# Altium schematic symbol library jlcpcb_2025_04_capacitors_extended_0805.schlib: 3281 symbols (part 6 of 18)
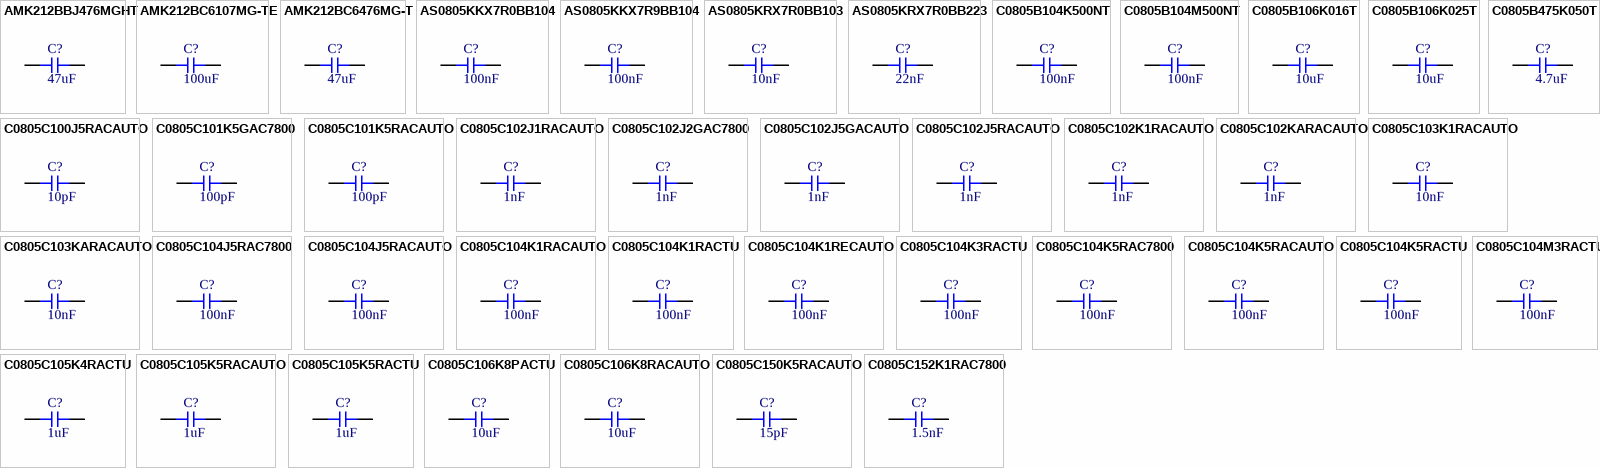
[diagram p87: symbols AMK212BBJ476MGHT to C0805C152K1RAC7800]

## C0805C104K5RACAUTO
designator C?  Capacitance: 100nF  (hidden comment: *)
Capacitor, Ceramic (MLCC), 100nF, ±10%, 50V, X7R, ±10%, SMD 0805; Manufacturer: KEMET; Manufacturer Part Number: C0805C104K5RACAUTO; Package Size: 0805; JLCPCB Basic Part: No; JLCPCB Part Number: C129641; Supplier 1: LCSC; Category: Capacitors - MLCC; Supplier Part Number 1: C129641; Tolerance: ±10%; Voltage Rating: 50V; Temperature Coefficient: X7R; RoHS: Yes; ComponentLink1Description: Datasheet; ComponentLink1URL: https://wmsc.lcsc.com/wmsc/upload/file/pdf/v2/lcsc/2304140030_KEMET-C0805C104K5RACAUTO_C129641.pdf; ComponentLink2Description: JLCPCB Part URL; ComponentLink2URL: https://jlcpcb.com/partdetail/C129641; ComponentLink3Description: LCSC Part URL; ComponentLink3URL: https://lcsc.com/product-detail/Multilayer-Ceramic-Capacitors-MLCC---SMD-SMT_KEMET-KEMET-C0805C104K5RACAUTO_C129641.html
footprint CAP-0805 (0805 (2012M) Capacitor)
pins: 1, 2

## C0805C104K5RACTU
designator C?  Capacitance: 100nF  (hidden comment: *)
Capacitor, Ceramic (MLCC), 100nF, ±10%, 50V, X7R, ±10%, SMD 0805; Manufacturer: KEMET; Manufacturer Part Number: C0805C104K5RACTU; Package Size: 0805; JLCPCB Basic Part: No; JLCPCB Part Number: C3018562; Supplier 1: LCSC; Category: Capacitors - MLCC; Supplier Part Number 1: C3018562; Tolerance: ±10%; Voltage Rating: 50V; Temperature Coefficient: X7R; RoHS: Yes; ComponentLink1Description: Datasheet; ComponentLink1URL: https://wmsc.lcsc.com/wmsc/upload/file/pdf/v2/lcsc/2206221715_KEMET-C0805C104K5RACTU_C3018562.pdf; ComponentLink2Description: JLCPCB Part URL; ComponentLink2URL: https://jlcpcb.com/partdetail/C3018562; ComponentLink3Description: LCSC Part URL; ComponentLink3URL: https://lcsc.com/product-detail/Multilayer-Ceramic-Capacitors-MLCC---SMD-SMT_KEMET-KEMET-C0805C104K5RACTU_C3018562.html
footprint CAP-0805 (0805 (2012M) Capacitor)
pins: 1, 2

## C0805C104M3RACTU
designator C?  Capacitance: 100nF  (hidden comment: *)
Capacitor, Ceramic (MLCC), 100nF, ±20%, 25V, X7R, ±20%, SMD 0805; Manufacturer: KEMET; Manufacturer Part Number: C0805C104M3RACTU; Package Size: 0805; JLCPCB Basic Part: No; JLCPCB Part Number: C2168659; Supplier 1: LCSC; Category: Capacitors - MLCC; Supplier Part Number 1: C2168659; Tolerance: ±20%; Voltage Rating: 25V; Temperature Coefficient: X7R; RoHS: Yes; ComponentLink1Description: Datasheet; ComponentLink1URL: https://wmsc.lcsc.com/wmsc/upload/file/pdf/v2/lcsc/2304140030_KEMET-C0805C104M3RACTU_C2168659.pdf; ComponentLink2Description: JLCPCB Part URL; ComponentLink2URL: https://jlcpcb.com/partdetail/C2168659; ComponentLink3Description: LCSC Part URL; ComponentLink3URL: https://lcsc.com/product-detail/Multilayer-Ceramic-Capacitors-MLCC---SMD-SMT_KEMET-KEMET-C0805C104M3RACTU_C2168659.html
footprint CAP-0805 (0805 (2012M) Capacitor)
pins: 1, 2

## C0805C105K4RACTU
designator C?  Capacitance: 1uF  (hidden comment: *)
Capacitor, Ceramic (MLCC), 1uF, ±10%, 16V, X7R, ±10%, SMD 0805; Manufacturer: KEMET; Manufacturer Part Number: C0805C105K4RACTU; Package Size: 0805; JLCPCB Basic Part: No; JLCPCB Part Number: C2167376; Supplier 1: LCSC; Category: Capacitors - MLCC; Supplier Part Number 1: C2167376; Tolerance: ±10%; Voltage Rating: 16V; Temperature Coefficient: X7R; RoHS: Yes; ComponentLink1Description: Datasheet; ComponentLink1URL: https://wmsc.lcsc.com/wmsc/upload/file/pdf/v2/lcsc/2304140030_KEMET-C0805C105K4RACTU_C2167376.pdf; ComponentLink2Description: JLCPCB Part URL; ComponentLink2URL: https://jlcpcb.com/partdetail/C2167376; ComponentLink3Description: LCSC Part URL; ComponentLink3URL: https://lcsc.com/product-detail/Multilayer-Ceramic-Capacitors-MLCC---SMD-SMT_KEMET-KEMET-C0805C105K4RACTU_C2167376.html
footprint CAP-0805 (0805 (2012M) Capacitor)
pins: 1, 2

## C0805C105K5RACAUTO
designator C?  Capacitance: 1uF  (hidden comment: *)
Capacitor, Ceramic (MLCC), 1uF, ±10%, 50V, X7R, ±10%, SMD 0805; Manufacturer: KEMET; Manufacturer Part Number: C0805C105K5RACAUTO; Package Size: 0805; JLCPCB Basic Part: No; JLCPCB Part Number: C3874210; Supplier 1: LCSC; Category: Capacitors - MLCC; Supplier Part Number 1: C3874210; Tolerance: ±10%; Voltage Rating: 50V; Temperature Coefficient: X7R; RoHS: Yes; ComponentLink1Description: Datasheet; ComponentLink1URL: https://wmsc.lcsc.com/wmsc/upload/file/pdf/v2/lcsc/2401181523_KEMET-C0805C105K5RACAUTO_C3874210.pdf; ComponentLink2Description: JLCPCB Part URL; ComponentLink2URL: https://jlcpcb.com/partdetail/C3874210; ComponentLink3Description: LCSC Part URL; ComponentLink3URL: https://lcsc.com/product-detail/Multilayer-Ceramic-Capacitors-MLCC---SMD-SMT_KEMET-KEMET-C0805C105K5RACAUTO_C3874210.html
footprint CAP-0805 (0805 (2012M) Capacitor)
pins: 1, 2

## C0805C105K5RACTU
designator C?  Capacitance: 1uF  (hidden comment: *)
Capacitor, Ceramic (MLCC), 1uF, 50V, X7R, SMD 0805; Manufacturer: KEMET; Manufacturer Part Number: C0805C105K5RACTU; Package Size: 0805; JLCPCB Basic Part: No; JLCPCB Part Number: C3018567; Supplier 1: LCSC; Category: Capacitors - MLCC; Supplier Part Number 1: C3018567; Voltage Rating: 50V; Temperature Coefficient: X7R; RoHS: Yes; ComponentLink1Description: Datasheet; ComponentLink1URL: https://wmsc.lcsc.com/wmsc/upload/file/pdf/v2/lcsc/2206221715_KEMET-C0805C105K5RACTU_C3018567.pdf; ComponentLink2Description: JLCPCB Part URL; ComponentLink2URL: https://jlcpcb.com/partdetail/C3018567; ComponentLink3Description: LCSC Part URL; ComponentLink3URL: https://lcsc.com/product-detail/Multilayer-Ceramic-Capacitors-MLCC---SMD-SMT_KEMET-KEMET-C0805C105K5RACTU_C3018567.html
footprint CAP-0805 (0805 (2012M) Capacitor)
pins: 1, 2

## C0805C106K8PACTU
designator C?  Capacitance: 10uF  (hidden comment: *)
Capacitor, Ceramic (MLCC), 10uF, ±10%, 10V, X5R, ±10%, SMD 0805; Manufacturer: KEMET; Manufacturer Part Number: C0805C106K8PACTU; Package Size: 0805; JLCPCB Basic Part: No; JLCPCB Part Number: C2167673; Supplier 1: LCSC; Category: Capacitors - MLCC; Supplier Part Number 1: C2167673; Tolerance: ±10%; Voltage Rating: 10V; Temperature Coefficient: X5R; RoHS: Yes; ComponentLink1Description: Datasheet; ComponentLink1URL: https://wmsc.lcsc.com/wmsc/upload/file/pdf/v2/lcsc/2304140030_KEMET-C0805C106K8PACTU_C2167673.pdf; ComponentLink2Description: JLCPCB Part URL; ComponentLink2URL: https://jlcpcb.com/partdetail/C2167673; ComponentLink3Description: LCSC Part URL; ComponentLink3URL: https://lcsc.com/product-detail/Multilayer-Ceramic-Capacitors-MLCC---SMD-SMT_KEMET-KEMET-C0805C106K8PACTU_C2167673.html
footprint CAP-0805 (0805 (2012M) Capacitor)
pins: 1, 2

## C0805C106K8RACAUTO
designator C?  Capacitance: 10uF  (hidden comment: *)
Capacitor, Ceramic (MLCC), 10uF, ±10%, 10V, X7R, ±10%, SMD 0805; Manufacturer: KEMET; Manufacturer Part Number: C0805C106K8RACAUTO; Package Size: 0805; JLCPCB Basic Part: No; JLCPCB Part Number: C696369; Supplier 1: LCSC; Category: Capacitors - MLCC; Supplier Part Number 1: C696369; Tolerance: ±10%; Voltage Rating: 10V; Temperature Coefficient: X7R; RoHS: Yes; ComponentLink1Description: Datasheet; ComponentLink1URL: https://wmsc.lcsc.com/wmsc/upload/file/pdf/v2/lcsc/2105241314_KEMET-C0805C106K8RACAUTO_C696369.pdf; ComponentLink2Description: JLCPCB Part URL; ComponentLink2URL: https://jlcpcb.com/partdetail/C696369; ComponentLink3Description: LCSC Part URL; ComponentLink3URL: https://lcsc.com/product-detail/Multilayer-Ceramic-Capacitors-MLCC---SMD-SMT_KEMET-KEMET-C0805C106K8RACAUTO_C696369.html
footprint CAP-0805 (0805 (2012M) Capacitor)
pins: 1, 2

## C0805C150K5RACAUTO
designator C?  Capacitance: 15pF  (hidden comment: *)
Capacitor, Ceramic (MLCC), 15pF, ±10%, 50V, X7R, ±10%, SMD 0805; Manufacturer: KEMET; Manufacturer Part Number: C0805C150K5RACAUTO; Package Size: 0805; JLCPCB Basic Part: No; JLCPCB Part Number: C129642; Supplier 1: LCSC; Category: Capacitors - MLCC; Supplier Part Number 1: C129642; Tolerance: ±10%; Voltage Rating: 50V; Temperature Coefficient: X7R; RoHS: Yes; ComponentLink1Description: Datasheet; ComponentLink1URL: https://wmsc.lcsc.com/wmsc/upload/file/pdf/v2/lcsc/2304140030_KEMET-C0805C150K5RACAUTO_C129642.pdf; ComponentLink2Description: JLCPCB Part URL; ComponentLink2URL: https://jlcpcb.com/partdetail/C129642; ComponentLink3Description: LCSC Part URL; ComponentLink3URL: https://lcsc.com/product-detail/Multilayer-Ceramic-Capacitors-MLCC---SMD-SMT_KEMET-KEMET-C0805C150K5RACAUTO_C129642.html
footprint CAP-0805 (0805 (2012M) Capacitor)
pins: 1, 2

## C0805C152K1RAC7800
designator C?  Capacitance: 1.5nF  (hidden comment: *)
Capacitor, Ceramic (MLCC), 1.5nF, ±10%, 100V, X7R, ±10%, SMD 0805; Manufacturer: KEMET; Manufacturer Part Number: C0805C152K1RAC7800; Package Size: 0805; JLCPCB Basic Part: No; JLCPCB Part Number: C141133; Supplier 1: LCSC; Category: Capacitors - MLCC; Supplier Part Number 1: C141133; Tolerance: ±10%; Voltage Rating: 100V; Temperature Coefficient: X7R; RoHS: Yes; ComponentLink1Description: Datasheet; ComponentLink1URL: https://wmsc.lcsc.com/wmsc/upload/file/pdf/v2/lcsc/2304140030_KEMET-C0805C152K1RAC7800_C141133.pdf; ComponentLink2Description: JLCPCB Part URL; ComponentLink2URL: https://jlcpcb.com/partdetail/C141133; ComponentLink3Description: LCSC Part URL; ComponentLink3URL: https://lcsc.com/product-detail/Multilayer-Ceramic-Capacitors-MLCC---SMD-SMT_KEMET-KEMET-C0805C152K1RAC7800_C141133.html
footprint CAP-0805 (0805 (2012M) Capacitor)
pins: 1, 2

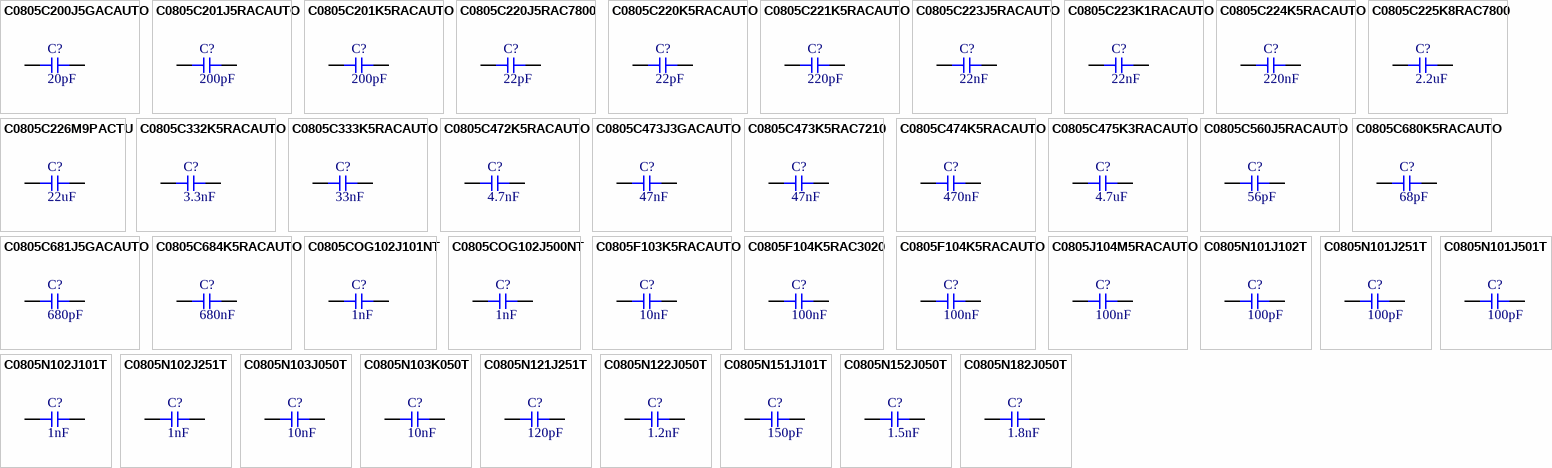
[diagram p23: symbols C0805C200J5GACAUTO to C0805N182J050T]

## C0805C200J5GACAUTO
designator C?  Capacitance: 20pF  (hidden comment: *)
Capacitor, Ceramic (MLCC), 20pF, ±5%, 50V, C0G, ±5%, SMD 0805; Manufacturer: KEMET; Manufacturer Part Number: C0805C200J5GACAUTO; Package Size: 0805; JLCPCB Basic Part: No; JLCPCB Part Number: C129644; Supplier 1: LCSC; Category: Capacitors - MLCC; Supplier Part Number 1: C129644; Tolerance: ±5%; Voltage Rating: 50V; Temperature Coefficient: C0G; RoHS: Yes; ComponentLink1Description: Datasheet; ComponentLink1URL: https://wmsc.lcsc.com/wmsc/upload/file/pdf/v2/lcsc/2304140030_KEMET-C0805C200J5GACAUTO_C129644.pdf; ComponentLink2Description: JLCPCB Part URL; ComponentLink2URL: https://jlcpcb.com/partdetail/C129644; ComponentLink3Description: LCSC Part URL; ComponentLink3URL: https://lcsc.com/product-detail/Multilayer-Ceramic-Capacitors-MLCC---SMD-SMT_KEMET-KEMET-C0805C200J5GACAUTO_C129644.html
footprint CAP-0805 (0805 (2012M) Capacitor)
pins: 1, 2

## C0805C201J5RACAUTO
designator C?  Capacitance: 200pF  (hidden comment: *)
Capacitor, Ceramic (MLCC), 200pF, ±5%, 50V, X7R, ±5%, SMD 0805; Manufacturer: KEMET; Manufacturer Part Number: C0805C201J5RACAUTO; Package Size: 0805; JLCPCB Basic Part: No; JLCPCB Part Number: C129645; Supplier 1: LCSC; Category: Capacitors - MLCC; Supplier Part Number 1: C129645; Tolerance: ±5%; Voltage Rating: 50V; Temperature Coefficient: X7R; RoHS: Yes; ComponentLink1Description: Datasheet; ComponentLink1URL: https://wmsc.lcsc.com/wmsc/upload/file/pdf/v2/lcsc/2304140030_KEMET-C0805C201J5RACAUTO_C129645.pdf; ComponentLink2Description: JLCPCB Part URL; ComponentLink2URL: https://jlcpcb.com/partdetail/C129645; ComponentLink3Description: LCSC Part URL; ComponentLink3URL: https://lcsc.com/product-detail/Multilayer-Ceramic-Capacitors-MLCC---SMD-SMT_KEMET-KEMET-C0805C201J5RACAUTO_C129645.html
footprint CAP-0805 (0805 (2012M) Capacitor)
pins: 1, 2

## C0805C201K5RACAUTO
designator C?  Capacitance: 200pF  (hidden comment: *)
Capacitor, Ceramic (MLCC), 200pF, ±10%, 50V, X7R, ±10%, SMD 0805; Manufacturer: KEMET; Manufacturer Part Number: C0805C201K5RACAUTO; Package Size: 0805; JLCPCB Basic Part: No; JLCPCB Part Number: C129646; Supplier 1: LCSC; Category: Capacitors - MLCC; Supplier Part Number 1: C129646; Tolerance: ±10%; Voltage Rating: 50V; Temperature Coefficient: X7R; RoHS: Yes; ComponentLink1Description: Datasheet; ComponentLink1URL: https://wmsc.lcsc.com/wmsc/upload/file/pdf/v2/lcsc/2304140030_KEMET-C0805C201K5RACAUTO_C129646.pdf; ComponentLink2Description: JLCPCB Part URL; ComponentLink2URL: https://jlcpcb.com/partdetail/C129646; ComponentLink3Description: LCSC Part URL; ComponentLink3URL: https://lcsc.com/product-detail/Multilayer-Ceramic-Capacitors-MLCC---SMD-SMT_KEMET-KEMET-C0805C201K5RACAUTO_C129646.html
footprint CAP-0805 (0805 (2012M) Capacitor)
pins: 1, 2

## C0805C220J5RAC7800
designator C?  Capacitance: 22pF  (hidden comment: *)
Capacitor, Ceramic (MLCC), 22pF, ±5%, 50V, X7R, ±5%, SMD 0805; Manufacturer: KEMET; Manufacturer Part Number: C0805C220J5RAC7800; Package Size: 0805; JLCPCB Basic Part: No; JLCPCB Part Number: C2176714; Supplier 1: LCSC; Category: Capacitors - MLCC; Supplier Part Number 1: C2176714; Tolerance: ±5%; Voltage Rating: 50V; Temperature Coefficient: X7R; RoHS: Yes; ComponentLink1Description: Datasheet; ComponentLink1URL: https://wmsc.lcsc.com/wmsc/upload/file/pdf/v2/lcsc/2304140030_KEMET-C0805C220J5RAC7800_C2176714.pdf; ComponentLink2Description: JLCPCB Part URL; ComponentLink2URL: https://jlcpcb.com/partdetail/C2176714; ComponentLink3Description: LCSC Part URL; ComponentLink3URL: https://lcsc.com/product-detail/Multilayer-Ceramic-Capacitors-MLCC---SMD-SMT_KEMET-KEMET-C0805C220J5RAC7800_C2176714.html
footprint CAP-0805 (0805 (2012M) Capacitor)
pins: 1, 2

## C0805C220K5RACAUTO
designator C?  Capacitance: 22pF  (hidden comment: *)
Capacitor, Ceramic (MLCC), 22pF, ±10%, 50V, X7R, ±10%, SMD 0805; Manufacturer: KEMET; Manufacturer Part Number: C0805C220K5RACAUTO; Package Size: 0805; JLCPCB Basic Part: No; JLCPCB Part Number: C129647; Supplier 1: LCSC; Category: Capacitors - MLCC; Supplier Part Number 1: C129647; Tolerance: ±10%; Voltage Rating: 50V; Temperature Coefficient: X7R; RoHS: Yes; ComponentLink1Description: Datasheet; ComponentLink1URL: https://wmsc.lcsc.com/wmsc/upload/file/pdf/v2/lcsc/2304140030_KEMET-C0805C220K5RACAUTO_C129647.pdf; ComponentLink2Description: JLCPCB Part URL; ComponentLink2URL: https://jlcpcb.com/partdetail/C129647; ComponentLink3Description: LCSC Part URL; ComponentLink3URL: https://lcsc.com/product-detail/Multilayer-Ceramic-Capacitors-MLCC---SMD-SMT_KEMET-KEMET-C0805C220K5RACAUTO_C129647.html
footprint CAP-0805 (0805 (2012M) Capacitor)
pins: 1, 2

## C0805C221K5RACAUTO
designator C?  Capacitance: 220pF  (hidden comment: *)
Capacitor, Ceramic (MLCC), 220pF, ±10%, 50V, X7R, ±10%, SMD 0805; Manufacturer: KEMET; Manufacturer Part Number: C0805C221K5RACAUTO; Package Size: 0805; JLCPCB Basic Part: No; JLCPCB Part Number: C129649; Supplier 1: LCSC; Category: Capacitors - MLCC; Supplier Part Number 1: C129649; Tolerance: ±10%; Voltage Rating: 50V; Temperature Coefficient: X7R; RoHS: Yes; ComponentLink1Description: Datasheet; ComponentLink1URL: https://wmsc.lcsc.com/wmsc/upload/file/pdf/v2/lcsc/2304140030_KEMET-C0805C221K5RACAUTO_C129649.pdf; ComponentLink2Description: JLCPCB Part URL; ComponentLink2URL: https://jlcpcb.com/partdetail/C129649; ComponentLink3Description: LCSC Part URL; ComponentLink3URL: https://lcsc.com/product-detail/Multilayer-Ceramic-Capacitors-MLCC---SMD-SMT_KEMET-KEMET-C0805C221K5RACAUTO_C129649.html
footprint CAP-0805 (0805 (2012M) Capacitor)
pins: 1, 2

## C0805C223J5RACAUTO
designator C?  Capacitance: 22nF  (hidden comment: *)
Capacitor, Ceramic (MLCC), 22nF, ±5%, 50V, X7R, ±5%, SMD 0805; Manufacturer: KEMET; Manufacturer Part Number: C0805C223J5RACAUTO; Package Size: 0805; JLCPCB Basic Part: No; JLCPCB Part Number: C129651; Supplier 1: LCSC; Category: Capacitors - MLCC; Supplier Part Number 1: C129651; Tolerance: ±5%; Voltage Rating: 50V; Temperature Coefficient: X7R; RoHS: Yes; ComponentLink1Description: Datasheet; ComponentLink1URL: https://wmsc.lcsc.com/wmsc/upload/file/pdf/v2/lcsc/2304140030_KEMET-C0805C223J5RACAUTO_C129651.pdf; ComponentLink2Description: JLCPCB Part URL; ComponentLink2URL: https://jlcpcb.com/partdetail/C129651; ComponentLink3Description: LCSC Part URL; ComponentLink3URL: https://lcsc.com/product-detail/Multilayer-Ceramic-Capacitors-MLCC---SMD-SMT_KEMET-KEMET-C0805C223J5RACAUTO_C129651.html
footprint CAP-0805 (0805 (2012M) Capacitor)
pins: 1, 2

## C0805C223K1RACAUTO
designator C?  Capacitance: 22nF  (hidden comment: *)
Capacitor, Ceramic (MLCC), 22nF, ±10%, 100V, X7R, ±10%, SMD 0805; Manufacturer: KEMET; Manufacturer Part Number: C0805C223K1RACAUTO; Package Size: 0805; JLCPCB Basic Part: No; JLCPCB Part Number: C561834; Supplier 1: LCSC; Category: Capacitors - MLCC; Supplier Part Number 1: C561834; Tolerance: ±10%; Voltage Rating: 100V; Temperature Coefficient: X7R; RoHS: Yes; ComponentLink1Description: Datasheet; ComponentLink1URL: https://wmsc.lcsc.com/wmsc/upload/file/pdf/v2/lcsc/2304140030_KEMET-C0805C223K1RACAUTO_C561834.pdf; ComponentLink2Description: JLCPCB Part URL; ComponentLink2URL: https://jlcpcb.com/partdetail/C561834; ComponentLink3Description: LCSC Part URL; ComponentLink3URL: https://lcsc.com/product-detail/Multilayer-Ceramic-Capacitors-MLCC---SMD-SMT_KEMET-KEMET-C0805C223K1RACAUTO_C561834.html
footprint CAP-0805 (0805 (2012M) Capacitor)
pins: 1, 2

## C0805C224K5RACAUTO
designator C?  Capacitance: 220nF  (hidden comment: *)
Capacitor, Ceramic (MLCC), 220nF, ±10%, 50V, X7R, ±10%, SMD 0805; Manufacturer: KEMET; Manufacturer Part Number: C0805C224K5RACAUTO; Package Size: 0805; JLCPCB Basic Part: No; JLCPCB Part Number: C129652; Supplier 1: LCSC; Category: Capacitors - MLCC; Supplier Part Number 1: C129652; Tolerance: ±10%; Voltage Rating: 50V; Temperature Coefficient: X7R; RoHS: Yes; ComponentLink1Description: Datasheet; ComponentLink1URL: https://wmsc.lcsc.com/wmsc/upload/file/pdf/v2/lcsc/2304140030_KEMET-C0805C224K5RACAUTO_C129652.pdf; ComponentLink2Description: JLCPCB Part URL; ComponentLink2URL: https://jlcpcb.com/partdetail/C129652; ComponentLink3Description: LCSC Part URL; ComponentLink3URL: https://lcsc.com/product-detail/Multilayer-Ceramic-Capacitors-MLCC---SMD-SMT_KEMET-KEMET-C0805C224K5RACAUTO_C129652.html
footprint CAP-0805 (0805 (2012M) Capacitor)
pins: 1, 2

## C0805C225K8RAC7800
designator C?  Capacitance: 2.2uF  (hidden comment: *)
Capacitor, Ceramic (MLCC), 2.2uF, ±10%, 10V, X7R, ±10%, SMD 0805; Manufacturer: KEMET; Manufacturer Part Number: C0805C225K8RAC7800; Package Size: 0805; JLCPCB Basic Part: No; JLCPCB Part Number: C599897; Supplier 1: LCSC; Category: Capacitors - MLCC; Supplier Part Number 1: C599897; Tolerance: ±10%; Voltage Rating: 10V; Temperature Coefficient: X7R; RoHS: Yes; ComponentLink1Description: Datasheet; ComponentLink1URL: https://wmsc.lcsc.com/wmsc/upload/file/pdf/v2/lcsc/2304140030_KEMET-C0805C225K8RAC7800_C599897.pdf; ComponentLink2Description: JLCPCB Part URL; ComponentLink2URL: https://jlcpcb.com/partdetail/C599897; ComponentLink3Description: LCSC Part URL; ComponentLink3URL: https://lcsc.com/product-detail/Multilayer-Ceramic-Capacitors-MLCC---SMD-SMT_KEMET-KEMET-C0805C225K8RAC7800_C599897.html
footprint CAP-0805 (0805 (2012M) Capacitor)
pins: 1, 2

## C0805C226M9PACTU
designator C?  Capacitance: 22uF  (hidden comment: *)
Capacitor, Ceramic (MLCC), 22uF, ±20%, 6.3V, X5R, ±20%, SMD 0805; Manufacturer: KEMET; Manufacturer Part Number: C0805C226M9PACTU; Package Size: 0805; JLCPCB Basic Part: No; JLCPCB Part Number: C452754; Supplier 1: LCSC; Category: Capacitors - MLCC; Supplier Part Number 1: C452754; Tolerance: ±20%; Voltage Rating: 6.3V; Temperature Coefficient: X5R; RoHS: Yes; ComponentLink1Description: Datasheet; ComponentLink1URL: https://wmsc.lcsc.com/wmsc/upload/file/pdf/v2/lcsc/2304140030_KEMET-C0805C226M9PACTU_C452754.pdf; ComponentLink2Description: JLCPCB Part URL; ComponentLink2URL: https://jlcpcb.com/partdetail/C452754; ComponentLink3Description: LCSC Part URL; ComponentLink3URL: https://lcsc.com/product-detail/Multilayer-Ceramic-Capacitors-MLCC---SMD-SMT_KEMET-KEMET-C0805C226M9PACTU_C452754.html
footprint CAP-0805 (0805 (2012M) Capacitor)
pins: 1, 2

## C0805C332K5RACAUTO
designator C?  Capacitance: 3.3nF  (hidden comment: *)
Capacitor, Ceramic (MLCC), 3.3nF, ±10%, 50V, X7R, ±10%, SMD 0805; Manufacturer: KEMET; Manufacturer Part Number: C0805C332K5RACAUTO; Package Size: 0805; JLCPCB Basic Part: No; JLCPCB Part Number: C129655; Supplier 1: LCSC; Category: Capacitors - MLCC; Supplier Part Number 1: C129655; Tolerance: ±10%; Voltage Rating: 50V; Temperature Coefficient: X7R; RoHS: Yes; ComponentLink1Description: Datasheet; ComponentLink1URL: https://wmsc.lcsc.com/wmsc/upload/file/pdf/v2/lcsc/2304140030_KEMET-C0805C332K5RACAUTO_C129655.pdf; ComponentLink2Description: JLCPCB Part URL; ComponentLink2URL: https://jlcpcb.com/partdetail/C129655; ComponentLink3Description: LCSC Part URL; ComponentLink3URL: https://lcsc.com/product-detail/Multilayer-Ceramic-Capacitors-MLCC---SMD-SMT_KEMET-KEMET-C0805C332K5RACAUTO_C129655.html
footprint CAP-0805 (0805 (2012M) Capacitor)
pins: 1, 2

## C0805C333K5RACAUTO
designator C?  Capacitance: 33nF  (hidden comment: *)
Capacitor, Ceramic (MLCC), 33nF, ±10%, 50V, X7R, ±10%, SMD 0805; Manufacturer: KEMET; Manufacturer Part Number: C0805C333K5RACAUTO; Package Size: 0805; JLCPCB Basic Part: No; JLCPCB Part Number: C129656; Supplier 1: LCSC; Category: Capacitors - MLCC; Supplier Part Number 1: C129656; Tolerance: ±10%; Voltage Rating: 50V; Temperature Coefficient: X7R; RoHS: Yes; ComponentLink1Description: Datasheet; ComponentLink1URL: https://wmsc.lcsc.com/wmsc/upload/file/pdf/v2/lcsc/2304140030_KEMET-C0805C333K5RACAUTO_C129656.pdf; ComponentLink2Description: JLCPCB Part URL; ComponentLink2URL: https://jlcpcb.com/partdetail/C129656; ComponentLink3Description: LCSC Part URL; ComponentLink3URL: https://lcsc.com/product-detail/Multilayer-Ceramic-Capacitors-MLCC---SMD-SMT_KEMET-KEMET-C0805C333K5RACAUTO_C129656.html
footprint CAP-0805 (0805 (2012M) Capacitor)
pins: 1, 2

## C0805C472K5RACAUTO
designator C?  Capacitance: 4.7nF  (hidden comment: *)
Capacitor, Ceramic (MLCC), 4.7nF, ±10%, 50V, X7R, ±10%, SMD 0805; Manufacturer: KEMET; Manufacturer Part Number: C0805C472K5RACAUTO; Package Size: 0805; JLCPCB Basic Part: No; JLCPCB Part Number: C129659; Supplier 1: LCSC; Category: Capacitors - MLCC; Supplier Part Number 1: C129659; Tolerance: ±10%; Voltage Rating: 50V; Temperature Coefficient: X7R; RoHS: Yes; ComponentLink1Description: Datasheet; ComponentLink1URL: https://wmsc.lcsc.com/wmsc/upload/file/pdf/v2/lcsc/2304140030_KEMET-C0805C472K5RACAUTO_C129659.pdf; ComponentLink2Description: JLCPCB Part URL; ComponentLink2URL: https://jlcpcb.com/partdetail/C129659; ComponentLink3Description: LCSC Part URL; ComponentLink3URL: https://lcsc.com/product-detail/Multilayer-Ceramic-Capacitors-MLCC---SMD-SMT_KEMET-KEMET-C0805C472K5RACAUTO_C129659.html
footprint CAP-0805 (0805 (2012M) Capacitor)
pins: 1, 2

## C0805C473J3GACAUTO
designator C?  Capacitance: 47nF  (hidden comment: *)
Capacitor, Ceramic (MLCC), 47nF, ±5%, 25V, C0G, ±5%, SMD 0805; Manufacturer: KEMET; Manufacturer Part Number: C0805C473J3GACAUTO; Package Size: 0805; JLCPCB Basic Part: No; JLCPCB Part Number: C2182212; Supplier 1: LCSC; Category: Capacitors - MLCC; Supplier Part Number 1: C2182212; Tolerance: ±5%; Voltage Rating: 25V; Temperature Coefficient: C0G; RoHS: Yes; ComponentLink1Description: Datasheet; ComponentLink1URL: https://wmsc.lcsc.com/wmsc/upload/file/pdf/v2/lcsc/2304140030_KEMET-C0805C473J3GACAUTO_C2182212.pdf; ComponentLink2Description: JLCPCB Part URL; ComponentLink2URL: https://jlcpcb.com/partdetail/C2182212; ComponentLink3Description: LCSC Part URL; ComponentLink3URL: https://lcsc.com/product-detail/Multilayer-Ceramic-Capacitors-MLCC---SMD-SMT_KEMET-KEMET-C0805C473J3GACAUTO_C2182212.html
footprint CAP-0805 (0805 (2012M) Capacitor)
pins: 1, 2

## C0805C473K5RAC7210
designator C?  Capacitance: 47nF  (hidden comment: *)
Capacitor, Ceramic (MLCC), 47nF, ±10%, 50V, X7R, ±10%, SMD 0805; Manufacturer: KEMET; Manufacturer Part Number: C0805C473K5RAC7210; Package Size: 0805; JLCPCB Basic Part: No; JLCPCB Part Number: C3849874; Supplier 1: LCSC; Category: Capacitors - MLCC; Supplier Part Number 1: C3849874; Tolerance: ±10%; Voltage Rating: 50V; Temperature Coefficient: X7R; RoHS: Yes; ComponentLink1Description: Datasheet; ComponentLink1URL: https://wmsc.lcsc.com/wmsc/upload/file/pdf/v2/lcsc/2401181604_KEMET-C0805C473K5RAC7210_C3849874.pdf; ComponentLink2Description: JLCPCB Part URL; ComponentLink2URL: https://jlcpcb.com/partdetail/C3849874; ComponentLink3Description: LCSC Part URL; ComponentLink3URL: https://lcsc.com/product-detail/Multilayer-Ceramic-Capacitors-MLCC---SMD-SMT_KEMET-KEMET-C0805C473K5RAC7210_C3849874.html
footprint CAP-0805 (0805 (2012M) Capacitor)
pins: 1, 2

## C0805C474K5RACAUTO
designator C?  Capacitance: 470nF  (hidden comment: *)
Capacitor, Ceramic (MLCC), 470nF, ±10%, 50V, X7R, ±10%, SMD 0805; Manufacturer: KEMET; Manufacturer Part Number: C0805C474K5RACAUTO; Package Size: 0805; JLCPCB Basic Part: No; JLCPCB Part Number: C129661; Supplier 1: LCSC; Category: Capacitors - MLCC; Supplier Part Number 1: C129661; Tolerance: ±10%; Voltage Rating: 50V; Temperature Coefficient: X7R; RoHS: Yes; ComponentLink1Description: Datasheet; ComponentLink1URL: https://wmsc.lcsc.com/wmsc/upload/file/pdf/v2/lcsc/2304140030_KEMET-C0805C474K5RACAUTO_C129661.pdf; ComponentLink2Description: JLCPCB Part URL; ComponentLink2URL: https://jlcpcb.com/partdetail/C129661; ComponentLink3Description: LCSC Part URL; ComponentLink3URL: https://lcsc.com/product-detail/Multilayer-Ceramic-Capacitors-MLCC---SMD-SMT_KEMET-KEMET-C0805C474K5RACAUTO_C129661.html
footprint CAP-0805 (0805 (2012M) Capacitor)
pins: 1, 2

## C0805C475K3RACAUTO
designator C?  Capacitance: 4.7uF  (hidden comment: *)
Capacitor, Ceramic (MLCC), 4.7uF, ±10%, 25V, X7R, ±10%, SMD 0805; Manufacturer: KEMET; Manufacturer Part Number: C0805C475K3RACAUTO; Package Size: 0805; JLCPCB Basic Part: No; JLCPCB Part Number: C696371; Supplier 1: LCSC; Category: Capacitors - MLCC; Supplier Part Number 1: C696371; Tolerance: ±10%; Voltage Rating: 25V; Temperature Coefficient: X7R; RoHS: Yes; ComponentLink1Description: Datasheet; ComponentLink1URL: https://wmsc.lcsc.com/wmsc/upload/file/pdf/v2/lcsc/2304140030_KEMET-C0805C475K3RACAUTO_C696371.pdf; ComponentLink2Description: JLCPCB Part URL; ComponentLink2URL: https://jlcpcb.com/partdetail/C696371; ComponentLink3Description: LCSC Part URL; ComponentLink3URL: https://lcsc.com/product-detail/Multilayer-Ceramic-Capacitors-MLCC---SMD-SMT_KEMET-KEMET-C0805C475K3RACAUTO_C696371.html
footprint CAP-0805 (0805 (2012M) Capacitor)
pins: 1, 2

## C0805C560J5RACAUTO
designator C?  Capacitance: 56pF  (hidden comment: *)
Capacitor, Ceramic (MLCC), 56pF, ±5%, 50V, X7R, ±5%, SMD 0805; Manufacturer: KEMET; Manufacturer Part Number: C0805C560J5RACAUTO; Package Size: 0805; JLCPCB Basic Part: No; JLCPCB Part Number: C129662; Supplier 1: LCSC; Category: Capacitors - MLCC; Supplier Part Number 1: C129662; Tolerance: ±5%; Voltage Rating: 50V; Temperature Coefficient: X7R; RoHS: Yes; ComponentLink1Description: Datasheet; ComponentLink1URL: https://wmsc.lcsc.com/wmsc/upload/file/pdf/v2/lcsc/1809111517_KEMET-C0805C560J5RACAUTO_C129662.pdf; ComponentLink2Description: JLCPCB Part URL; ComponentLink2URL: https://jlcpcb.com/partdetail/C129662; ComponentLink3Description: LCSC Part URL; ComponentLink3URL: https://lcsc.com/product-detail/Multilayer-Ceramic-Capacitors-MLCC---SMD-SMT_KEMET-KEMET-C0805C560J5RACAUTO_C129662.html
footprint CAP-0805 (0805 (2012M) Capacitor)
pins: 1, 2

## C0805C680K5RACAUTO
designator C?  Capacitance: 68pF  (hidden comment: *)
Capacitor, Ceramic (MLCC), 68pF, ±10%, 50V, X7R, ±10%, SMD 0805; Manufacturer: KEMET; Manufacturer Part Number: C0805C680K5RACAUTO; Package Size: 0805; JLCPCB Basic Part: No; JLCPCB Part Number: C129664; Supplier 1: LCSC; Category: Capacitors - MLCC; Supplier Part Number 1: C129664; Tolerance: ±10%; Voltage Rating: 50V; Temperature Coefficient: X7R; RoHS: Yes; ComponentLink1Description: Datasheet; ComponentLink1URL: https://wmsc.lcsc.com/wmsc/upload/file/pdf/v2/lcsc/2304140030_KEMET-C0805C680K5RACAUTO_C129664.pdf; ComponentLink2Description: JLCPCB Part URL; ComponentLink2URL: https://jlcpcb.com/partdetail/C129664; ComponentLink3Description: LCSC Part URL; ComponentLink3URL: https://lcsc.com/product-detail/Multilayer-Ceramic-Capacitors-MLCC---SMD-SMT_KEMET-KEMET-C0805C680K5RACAUTO_C129664.html
footprint CAP-0805 (0805 (2012M) Capacitor)
pins: 1, 2

## C0805C681J5GACAUTO
designator C?  Capacitance: 680pF  (hidden comment: *)
Capacitor, Ceramic (MLCC), 680pF, ±5%, 50V, C0G, ±5%, SMD 0805; Manufacturer: KEMET; Manufacturer Part Number: C0805C681J5GACAUTO; Package Size: 0805; JLCPCB Basic Part: No; JLCPCB Part Number: C129665; Supplier 1: LCSC; Category: Capacitors - MLCC; Supplier Part Number 1: C129665; Tolerance: ±5%; Voltage Rating: 50V; Temperature Coefficient: C0G; RoHS: Yes; ComponentLink1Description: Datasheet; ComponentLink1URL: https://wmsc.lcsc.com/wmsc/upload/file/pdf/v2/lcsc/1810251820_KEMET-C0805C681J5GACAUTO_C129665.pdf; ComponentLink2Description: JLCPCB Part URL; ComponentLink2URL: https://jlcpcb.com/partdetail/C129665; ComponentLink3Description: LCSC Part URL; ComponentLink3URL: https://lcsc.com/product-detail/Multilayer-Ceramic-Capacitors-MLCC---SMD-SMT_KEMET-KEMET-C0805C681J5GACAUTO_C129665.html
footprint CAP-0805 (0805 (2012M) Capacitor)
pins: 1, 2

## C0805C684K5RACAUTO
designator C?  Capacitance: 680nF  (hidden comment: *)
Capacitor, Ceramic (MLCC), 680nF, ±10%, 50V, X7R, ±10%, SMD 0805; Manufacturer: KEMET; Manufacturer Part Number: C0805C684K5RACAUTO; Package Size: 0805; JLCPCB Basic Part: No; JLCPCB Part Number: C599962; Supplier 1: LCSC; Category: Capacitors - MLCC; Supplier Part Number 1: C599962; Tolerance: ±10%; Voltage Rating: 50V; Temperature Coefficient: X7R; RoHS: Yes; ComponentLink1Description: Datasheet; ComponentLink1URL: https://wmsc.lcsc.com/wmsc/upload/file/pdf/v2/lcsc/2304140030_KEMET-C0805C684K5RACAUTO_C599962.pdf; ComponentLink2Description: JLCPCB Part URL; ComponentLink2URL: https://jlcpcb.com/partdetail/C599962; ComponentLink3Description: LCSC Part URL; ComponentLink3URL: https://lcsc.com/product-detail/Multilayer-Ceramic-Capacitors-MLCC---SMD-SMT_KEMET-KEMET-C0805C684K5RACAUTO_C599962.html
footprint CAP-0805 (0805 (2012M) Capacitor)
pins: 1, 2

## C0805COG102J101NT
designator C?  Capacitance: 1nF  (hidden comment: *)
Capacitor, Ceramic (MLCC), 1nF, 100V, SMD 0805; Manufacturer: SANYEAR; Manufacturer Part Number: C0805COG102J101NT; Package Size: 0805; JLCPCB Basic Part: No; JLCPCB Part Number: C2835511; Supplier 1: LCSC; Category: Capacitors - MLCC; Supplier Part Number 1: C2835511; Voltage Rating: 100V; RoHS: Yes; ComponentLink1Description: Datasheet; ComponentLink1URL: https://wmsc.lcsc.com/wmsc/upload/file/pdf/v2/lcsc/2304140030_SANYEAR-C0805COG102J101NT_C2835511.pdf; ComponentLink2Description: JLCPCB Part URL; ComponentLink2URL: https://jlcpcb.com/partdetail/C2835511; ComponentLink3Description: LCSC Part URL; ComponentLink3URL: https://lcsc.com/product-detail/Multilayer-Ceramic-Capacitors-MLCC---SMD-SMT_SANYEAR-SANYEAR-C0805COG102J101NT_C2835511.html
footprint CAP-0805 (0805 (2012M) Capacitor)
pins: 1, 2

## C0805COG102J500NT
designator C?  Capacitance: 1nF  (hidden comment: *)
Capacitor, Ceramic (MLCC), 1nF, 50V, SMD 0805; Manufacturer: SANYEAR; Manufacturer Part Number: C0805COG102J500NT; Package Size: 0805; JLCPCB Basic Part: No; JLCPCB Part Number: C2835510; Supplier 1: LCSC; Category: Capacitors - MLCC; Supplier Part Number 1: C2835510; Voltage Rating: 50V; RoHS: Yes; ComponentLink1Description: Datasheet; ComponentLink1URL: https://wmsc.lcsc.com/wmsc/upload/file/pdf/v2/lcsc/2304140030_SANYEAR-C0805COG102J500NT_C2835510.pdf; ComponentLink2Description: JLCPCB Part URL; ComponentLink2URL: https://jlcpcb.com/partdetail/C2835510; ComponentLink3Description: LCSC Part URL; ComponentLink3URL: https://lcsc.com/product-detail/Multilayer-Ceramic-Capacitors-MLCC---SMD-SMT_SANYEAR-SANYEAR-C0805COG102J500NT_C2835510.html
footprint CAP-0805 (0805 (2012M) Capacitor)
pins: 1, 2

## C0805F103K5RACAUTO
designator C?  Capacitance: 10nF  (hidden comment: *)
Capacitor, Ceramic (MLCC), 10nF, ±10%, 50V, X7R, ±10%, SMD 0805; Manufacturer: KEMET; Manufacturer Part Number: C0805F103K5RACAUTO; Package Size: 0805; JLCPCB Basic Part: No; JLCPCB Part Number: C141159; Supplier 1: LCSC; Category: Capacitors - MLCC; Supplier Part Number 1: C141159; Tolerance: ±10%; Voltage Rating: 50V; Temperature Coefficient: X7R; RoHS: Yes; ComponentLink1Description: Datasheet; ComponentLink1URL: https://wmsc.lcsc.com/wmsc/upload/file/pdf/v2/lcsc/2304140030_KEMET-C0805F103K5RACAUTO_C141159.pdf; ComponentLink2Description: JLCPCB Part URL; ComponentLink2URL: https://jlcpcb.com/partdetail/C141159; ComponentLink3Description: LCSC Part URL; ComponentLink3URL: https://lcsc.com/product-detail/Multilayer-Ceramic-Capacitors-MLCC---SMD-SMT_KEMET-KEMET-C0805F103K5RACAUTO_C141159.html
footprint CAP-0805 (0805 (2012M) Capacitor)
pins: 1, 2

## C0805F104K5RAC3020
designator C?  Capacitance: 100nF  (hidden comment: *)
Capacitor, Ceramic (MLCC), 100nF, ±10%, 50V, X7R, ±10%, SMD 0805; Manufacturer: KEMET; Manufacturer Part Number: C0805F104K5RAC3020; Package Size: 0805; JLCPCB Basic Part: No; JLCPCB Part Number: C1865232; Supplier 1: LCSC; Category: Capacitors - MLCC; Supplier Part Number 1: C1865232; Tolerance: ±10%; Voltage Rating: 50V; Temperature Coefficient: X7R; RoHS: Yes; ComponentLink1Description: Datasheet; ComponentLink1URL: https://wmsc.lcsc.com/wmsc/upload/file/pdf/v2/lcsc/2304140030_KEMET-C0805F104K5RAC3020_C1865232.pdf; ComponentLink2Description: JLCPCB Part URL; ComponentLink2URL: https://jlcpcb.com/partdetail/C1865232; ComponentLink3Description: LCSC Part URL; ComponentLink3URL: https://lcsc.com/product-detail/Multilayer-Ceramic-Capacitors-MLCC---SMD-SMT_KEMET-KEMET-C0805F104K5RAC3020_C1865232.html
footprint CAP-0805 (0805 (2012M) Capacitor)
pins: 1, 2

## C0805F104K5RACAUTO
designator C?  Capacitance: 100nF  (hidden comment: *)
Capacitor, Ceramic (MLCC), 100nF, ±10%, 50V, X7R, ±10%, SMD 0805; Manufacturer: KEMET; Manufacturer Part Number: C0805F104K5RACAUTO; Package Size: 0805; JLCPCB Basic Part: No; JLCPCB Part Number: C141162; Supplier 1: LCSC; Category: Capacitors - MLCC; Supplier Part Number 1: C141162; Tolerance: ±10%; Voltage Rating: 50V; Temperature Coefficient: X7R; RoHS: Yes; ComponentLink1Description: Datasheet; ComponentLink1URL: https://wmsc.lcsc.com/wmsc/upload/file/pdf/v2/lcsc/2304140030_KEMET-C0805F104K5RACAUTO_C141162.pdf; ComponentLink2Description: JLCPCB Part URL; ComponentLink2URL: https://jlcpcb.com/partdetail/C141162; ComponentLink3Description: LCSC Part URL; ComponentLink3URL: https://lcsc.com/product-detail/Multilayer-Ceramic-Capacitors-MLCC---SMD-SMT_KEMET-KEMET-C0805F104K5RACAUTO_C141162.html
footprint CAP-0805 (0805 (2012M) Capacitor)
pins: 1, 2

## C0805J104M5RACAUTO
designator C?  Capacitance: 100nF  (hidden comment: *)
Capacitor, Ceramic (MLCC), 100nF, ±20%, 50V, X7R, ±20%, SMD 0805; Manufacturer: KEMET; Manufacturer Part Number: C0805J104M5RACAUTO; Package Size: 0805; JLCPCB Basic Part: No; JLCPCB Part Number: C1864280; Supplier 1: LCSC; Category: Capacitors - MLCC; Supplier Part Number 1: C1864280; Tolerance: ±20%; Voltage Rating: 50V; Temperature Coefficient: X7R; RoHS: Yes; ComponentLink1Description: Datasheet; ComponentLink1URL: https://wmsc.lcsc.com/wmsc/upload/file/pdf/v2/lcsc/2304140030_KEMET-C0805J104M5RACAUTO_C1864280.pdf; ComponentLink2Description: JLCPCB Part URL; ComponentLink2URL: https://jlcpcb.com/partdetail/C1864280; ComponentLink3Description: LCSC Part URL; ComponentLink3URL: https://lcsc.com/product-detail/Multilayer-Ceramic-Capacitors-MLCC---SMD-SMT_KEMET-KEMET-C0805J104M5RACAUTO_C1864280.html
footprint CAP-0805 (0805 (2012M) Capacitor)
pins: 1, 2

## C0805N101J102T
designator C?  Capacitance: 100pF  (hidden comment: *)
Capacitor, Ceramic (MLCC), 100pF, ±5%, 1kV, NP0, ±5%, SMD 0805; Manufacturer: IHHEC(HOLY STONE ENTERPRISE CO., LTD); Manufacturer Part Number: C0805N101J102T; Package Size: 0805; JLCPCB Basic Part: No; JLCPCB Part Number: C961511; Supplier 1: LCSC; Category: Capacitors - MLCC; Supplier Part Number 1: C961511; Tolerance: ±5%; Voltage Rating: 1kV; Temperature Coefficient: NP0; RoHS: Yes; ComponentLink1Description: Datasheet; ComponentLink1URL: https://wmsc.lcsc.com/wmsc/upload/file/pdf/v2/lcsc/2304140030_IHHEC-HOLY-STONE-ENTERPRISE-CO---LTD-C0805N101J102T_C961511.pdf; ComponentLink2Description: JLCPCB Part URL; ComponentLink2URL: https://jlcpcb.com/partdetail/C961511; ComponentLink3Description: LCSC Part URL; ComponentLink3URL: https://lcsc.com/product-detail/Multilayer-Ceramic-Capacitors-MLCC---SMD-SMT_IHHECHOLY-STONE-ENTERPRISE-CO.%2C-LTD-IHHECHOLY-STONE-ENTERPRISE-CO.%2C-LTD-C0805N101J102T_C961511.html
footprint CAP-0805 (0805 (2012M) Capacitor)
pins: 1, 2

## C0805N101J251T
designator C?  Capacitance: 100pF  (hidden comment: *)
Capacitor, Ceramic (MLCC), 100pF, ±5%, 250V, NP0, ±5%, SMD 0805; Manufacturer: IHHEC(HOLY STONE ENTERPRISE CO., LTD); Manufacturer Part Number: C0805N101J251T; Package Size: 0805; JLCPCB Basic Part: No; JLCPCB Part Number: C105913; Supplier 1: LCSC; Category: Capacitors - MLCC; Supplier Part Number 1: C105913; Tolerance: ±5%; Voltage Rating: 250V; Temperature Coefficient: NP0; RoHS: Yes; ComponentLink1Description: Datasheet; ComponentLink1URL: https://wmsc.lcsc.com/wmsc/upload/file/pdf/v2/lcsc/2304140030_IHHEC-HOLY-STONE-ENTERPRISE-CO---LTD-C0805N101J251T_C105913.pdf; ComponentLink2Description: JLCPCB Part URL; ComponentLink2URL: https://jlcpcb.com/partdetail/C105913; ComponentLink3Description: LCSC Part URL; ComponentLink3URL: https://lcsc.com/product-detail/Multilayer-Ceramic-Capacitors-MLCC---SMD-SMT_IHHECHOLY-STONE-ENTERPRISE-CO.%2C-LTD-IHHECHOLY-STONE-ENTERPRISE-CO.%2C-LTD-C0805N101J251T_C105913.html
footprint CAP-0805 (0805 (2012M) Capacitor)
pins: 1, 2

## C0805N101J501T
designator C?  Capacitance: 100pF  (hidden comment: *)
Capacitor, Ceramic (MLCC), 100pF, ±5%, 500V, NP0, ±5%, SMD 0805; Manufacturer: IHHEC(HOLY STONE ENTERPRISE CO., LTD); Manufacturer Part Number: C0805N101J501T; Package Size: 0805; JLCPCB Basic Part: No; JLCPCB Part Number: C105914; Supplier 1: LCSC; Category: Capacitors - MLCC; Supplier Part Number 1: C105914; Tolerance: ±5%; Voltage Rating: 500V; Temperature Coefficient: NP0; RoHS: Yes; ComponentLink1Description: Datasheet; ComponentLink1URL: https://wmsc.lcsc.com/wmsc/upload/file/pdf/v2/lcsc/2304140030_IHHEC-HOLY-STONE-ENTERPRISE-CO---LTD-C0805N101J501T_C105914.pdf; ComponentLink2Description: JLCPCB Part URL; ComponentLink2URL: https://jlcpcb.com/partdetail/C105914; ComponentLink3Description: LCSC Part URL; ComponentLink3URL: https://lcsc.com/product-detail/Multilayer-Ceramic-Capacitors-MLCC---SMD-SMT_IHHECHOLY-STONE-ENTERPRISE-CO.%2C-LTD-IHHECHOLY-STONE-ENTERPRISE-CO.%2C-LTD-C0805N101J501T_C105914.html
footprint CAP-0805 (0805 (2012M) Capacitor)
pins: 1, 2

## C0805N102J101T
designator C?  Capacitance: 1nF  (hidden comment: *)
Capacitor, Ceramic (MLCC), 1nF, ±5%, 100V, NP0, ±5%, SMD 0805; Manufacturer: IHHEC(HOLY STONE ENTERPRISE CO., LTD); Manufacturer Part Number: C0805N102J101T; Package Size: 0805; JLCPCB Basic Part: No; JLCPCB Part Number: C105915; Supplier 1: LCSC; Category: Capacitors - MLCC; Supplier Part Number 1: C105915; Tolerance: ±5%; Voltage Rating: 100V; Temperature Coefficient: NP0; RoHS: Yes; ComponentLink1Description: Datasheet; ComponentLink1URL: https://wmsc.lcsc.com/wmsc/upload/file/pdf/v2/lcsc/2304140030_IHHEC-HOLY-STONE-ENTERPRISE-CO---LTD-C0805N102J101T_C105915.pdf; ComponentLink2Description: JLCPCB Part URL; ComponentLink2URL: https://jlcpcb.com/partdetail/C105915; ComponentLink3Description: LCSC Part URL; ComponentLink3URL: https://lcsc.com/product-detail/Multilayer-Ceramic-Capacitors-MLCC---SMD-SMT_IHHECHOLY-STONE-ENTERPRISE-CO.%2C-LTD-IHHECHOLY-STONE-ENTERPRISE-CO.%2C-LTD-C0805N102J101T_C105915.html
footprint CAP-0805 (0805 (2012M) Capacitor)
pins: 1, 2

## C0805N102J251T
designator C?  Capacitance: 1nF  (hidden comment: *)
Capacitor, Ceramic (MLCC), 1nF, ±5%, 250V, NP0, ±5%, SMD 0805; Manufacturer: IHHEC(HOLY STONE ENTERPRISE CO., LTD); Manufacturer Part Number: C0805N102J251T; Package Size: 0805; JLCPCB Basic Part: No; JLCPCB Part Number: C105916; Supplier 1: LCSC; Category: Capacitors - MLCC; Supplier Part Number 1: C105916; Tolerance: ±5%; Voltage Rating: 250V; Temperature Coefficient: NP0; RoHS: Yes; ComponentLink1Description: Datasheet; ComponentLink1URL: https://wmsc.lcsc.com/wmsc/upload/file/pdf/v2/lcsc/2304140030_IHHEC-HOLY-STONE-ENTERPRISE-CO---LTD-C0805N102J251T_C105916.pdf; ComponentLink2Description: JLCPCB Part URL; ComponentLink2URL: https://jlcpcb.com/partdetail/C105916; ComponentLink3Description: LCSC Part URL; ComponentLink3URL: https://lcsc.com/product-detail/Multilayer-Ceramic-Capacitors-MLCC---SMD-SMT_IHHECHOLY-STONE-ENTERPRISE-CO.%2C-LTD-IHHECHOLY-STONE-ENTERPRISE-CO.%2C-LTD-C0805N102J251T_C105916.html
footprint CAP-0805 (0805 (2012M) Capacitor)
pins: 1, 2

## C0805N103J050T
designator C?  Capacitance: 10nF  (hidden comment: *)
Capacitor, Ceramic (MLCC), 10nF, ±5%, 50V, NP0, ±5%, SMD 0805; Manufacturer: IHHEC(HOLY STONE ENTERPRISE CO., LTD); Manufacturer Part Number: C0805N103J050T; Package Size: 0805; JLCPCB Basic Part: No; JLCPCB Part Number: C105917; Supplier 1: LCSC; Category: Capacitors - MLCC; Supplier Part Number 1: C105917; Tolerance: ±5%; Voltage Rating: 50V; Temperature Coefficient: NP0; RoHS: Yes; ComponentLink1Description: Datasheet; ComponentLink1URL: https://wmsc.lcsc.com/wmsc/upload/file/pdf/v2/lcsc/2304140030_IHHEC-HOLY-STONE-ENTERPRISE-CO---LTD-C0805N103J050T_C105917.pdf; ComponentLink2Description: JLCPCB Part URL; ComponentLink2URL: https://jlcpcb.com/partdetail/C105917; ComponentLink3Description: LCSC Part URL; ComponentLink3URL: https://lcsc.com/product-detail/Multilayer-Ceramic-Capacitors-MLCC---SMD-SMT_IHHECHOLY-STONE-ENTERPRISE-CO.%2C-LTD-IHHECHOLY-STONE-ENTERPRISE-CO.%2C-LTD-C0805N103J050T_C105917.html
footprint CAP-0805 (0805 (2012M) Capacitor)
pins: 1, 2

## C0805N103K050T
designator C?  Capacitance: 10nF  (hidden comment: *)
Capacitor, Ceramic (MLCC), 10nF, ±10%, 50V, NP0, ±10%, SMD 0805; Manufacturer: IHHEC(HOLY STONE ENTERPRISE CO., LTD); Manufacturer Part Number: C0805N103K050T; Package Size: 0805; JLCPCB Basic Part: No; JLCPCB Part Number: C105918; Supplier 1: LCSC; Category: Capacitors - MLCC; Supplier Part Number 1: C105918; Tolerance: ±10%; Voltage Rating: 50V; Temperature Coefficient: NP0; RoHS: Yes; ComponentLink1Description: Datasheet; ComponentLink1URL: https://wmsc.lcsc.com/wmsc/upload/file/pdf/v2/lcsc/2304140030_IHHEC-HOLY-STONE-ENTERPRISE-CO---LTD-C0805N103K050T_C105918.pdf; ComponentLink2Description: JLCPCB Part URL; ComponentLink2URL: https://jlcpcb.com/partdetail/C105918; ComponentLink3Description: LCSC Part URL; ComponentLink3URL: https://lcsc.com/product-detail/Multilayer-Ceramic-Capacitors-MLCC---SMD-SMT_IHHECHOLY-STONE-ENTERPRISE-CO.%2C-LTD-IHHECHOLY-STONE-ENTERPRISE-CO.%2C-LTD-C0805N103K050T_C105918.html
footprint CAP-0805 (0805 (2012M) Capacitor)
pins: 1, 2
